# Altium footprint library pcb2D3D库101.PcbLib: 411 footprints (part 6 of 26)
Each footprint in its own frame and in the unit in brackets; x right, y up, seen from the top. Pads: shape width x height; smd on the part's side, far side on the other; paste and mask are expansions set on the pad; w line width, h text height; cw(c..) or ccw(c..) is an arc to the next point about the centre after c.
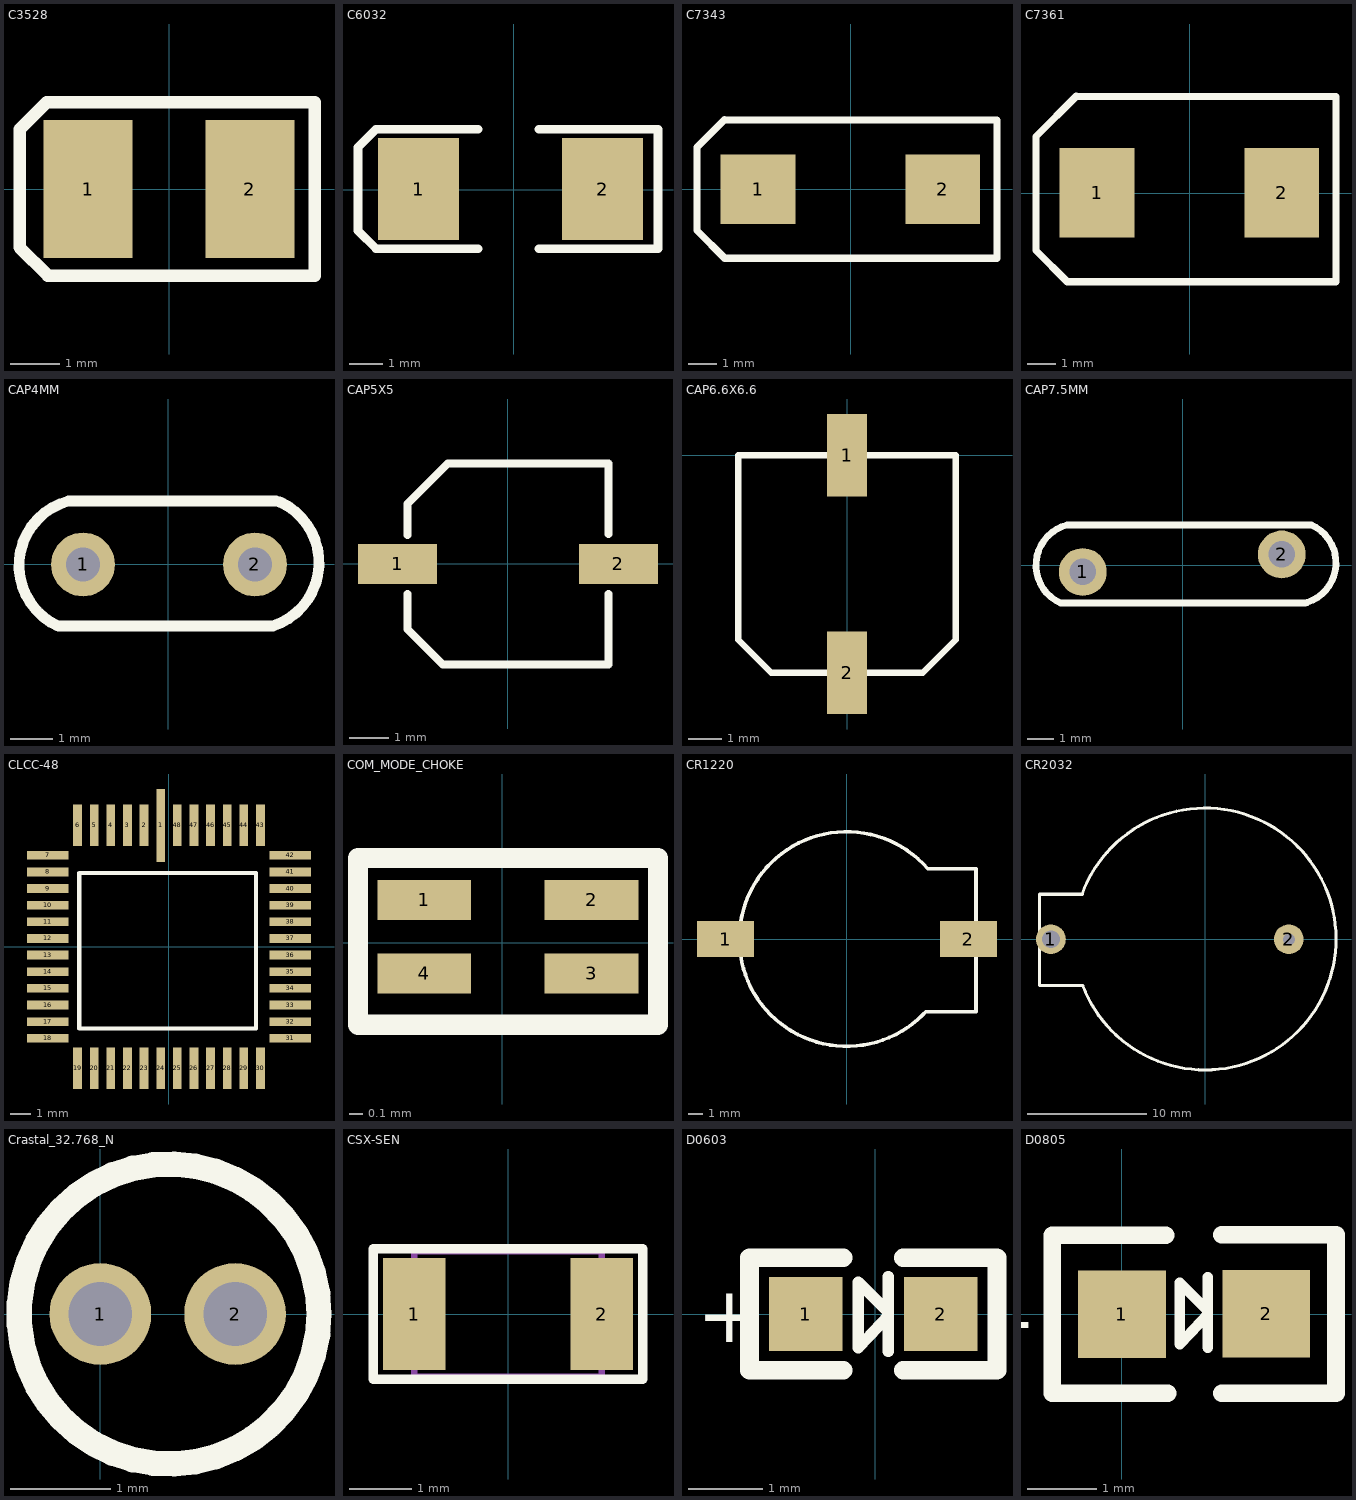
[diagram p5: the footprints below, top view; thin cyan lines are the x and y axes]

## C3528 [mil] "B型"
pads (2):
  rect 70.87x110 smd: 1(-64.5,0) 2(64.5,0)
TopOverlay:
  lines w10: -119,-46.5 -96.5,-69 116,-69 116,69 -97.5,69 -119,47.5 -119,-46.5
3D body "TAJ-B.STEP": height 74.8, standoff 0, extent -68.9,-55.11 68.9,55.12

## C6032 [mil] "C型"
pads (2):
  rect 95x120 smd: 1(-112,1) 2(104,1)
TopOverlay:
  lines w10: -42,-69 -156,-69 -162,-69 -183,-48 -183,50 -163,70 -162,71 -42,71 ; 29,-69 169,-69 169,71 29,71
3D body "TAJ-C.STEP": height 102.36, standoff 0, extent -121.11,-61.99 115.11,63.99

## C7343 [mm] "D型"
pads (2):
  rect 2.6x2.4 smd: 1(-3.202,0.007) 2(3.198,0.007)
TopOverlay:
  lines w0.254: -4.369,-2.388 5.08,-2.388 5.08,2.388 ; -4.362,-2.388 -5.325,-1.425 -5.325,1.457 -4.369,2.413 5.08,2.406
3D body: height 0.3, standoff 0, extent -3.487,-0.869 -3.392,0.82
3D body: height 0.3, standoff 0, extent 3.308,-0.855 3.512,0.915
3D body "TAJ-D.STEP": height 2.9, standoff 0, extent -3.65,-2.124 3.65,2.176

## C7361 [mm] "D型"
pads (2):
  rect 2.6x3.1 smd: 1(-3.202,0.007) 2(3.198,0.007)
TopOverlay:
  lines w0.254: -5.325,-1.99 -4.242,-3.073 5.08,-3.073 5.08,3.352 -3.931,3.359 -5.325,1.965 -5.325,-1.99
3D body "capcp7361x38.step": height 3.45, standoff 0, extent -3.75,-3.048 3.75,3.252

## CAP4MM [mm]
pads (2):
  round 1.5 hole 0.8: 1(-2,0) 2(2.04,0)
TopOverlay:
  lines w0.254: -2.58,-1.45 cw(c-1.94,-0.023) -2.34,1.49 ; -2.52,-1.45 2.42,-1.45 ; -2.32,1.49 2.538,1.49 ; 2.459,-1.447 ccw(c1.98,0.042) 2.62,1.47
3D body "RAD.2.step": height 7.5, standoff -1, extent -3.465,-0.899 3.526,0.798

## CAP5X5 [mm]
pads (2):
  rect 2x1 smd: 1(-2.794,0) 2(2.794,0)
TopOverlay:
  lines w0.2: -2.54,-0.762 -2.54,-1.651 -1.651,-2.54 2.54,-2.54 2.54,-0.762 ; -2.54,0.73 -2.54,1.524 -1.524,2.54 2.54,2.54 2.54,0.762
3D body "SL-B.STEP": height 5.2, standoff 0, extent -2.274,-2.15 2.326,2.15

## CAP6.6X6.6 [mm] "SMDC"
pads (2):
  rect 1.2x2.5 smd: 1(0,0) 2(0,-6.6)
TopOverlay:
  lines w0.2: -3.3,-5.6 -3.3,0 0,0 3.3,0 3.3,-5.6 2.3,-6.6 -2.3,-6.6 -3.3,-5.6
3D body "SL-E.STEP": height 5.2, standoff 0, extent -3.275,-6.802 3.325,0.198

## CAP7.5MM [mm]
pads (2):
  round 1.8 hole 1: 1(-3.759,-0.254) 2(3.734,0.406)
TopOverlay:
  lines w0.254: 4.623,-1.425 -4.597,-1.425 cw(c-3.958,0.003) -4.357,1.516 4.851,1.516 cw(c4.212,0.088) 4.69,-1.401
3D body "final MOV7,5.step": height 18.5, standoff 0, extent -5.5,-0.849 5.784,1

## CLCC-48 [mm]
pads (48):
  rect 0.42x3.5 smd: 1(-0.4,5.84)
  rect 0.42x2 smd: 2(-1.2,5.84) 3(-2,5.84) 4(-2.8,5.84) 5(-3.6,5.84) 6(-4.4,5.84) 19(-4.4,-5.84) 20(-3.6,-5.84) 21(-2.8,-5.84) 22(-2,-5.84) 23(-1.2,-5.84) 24(-0.4,-5.84) 25(0.4,-5.84) 26(1.2,-5.84) 27(2,-5.84) 28(2.8,-5.84) 29(3.6,-5.84) 30(4.4,-5.84) 43(4.4,5.84) 44(3.6,5.84) 45(2.8,5.84) 46(2,5.84) 47(1.2,5.84) 48(0.4,5.84)
  rect 2x0.42 smd: 7(-5.84,4.4) 8(-5.84,3.6) 9(-5.84,2.8) 10(-5.84,2) 11(-5.84,1.2) 12(-5.84,0.4) 13(-5.84,-0.4) 14(-5.84,-1.2) 15(-5.84,-2) 16(-5.84,-2.8) 17(-5.84,-3.6) 18(-5.84,-4.4) 31(5.84,-4.4) 32(5.84,-3.6) 33(5.84,-2.8) 34(5.84,-2) 35(5.84,-1.2) 36(5.84,-0.4) 37(5.84,0.4) 38(5.84,1.2) 39(5.84,2) 40(5.84,2.8) 41(5.84,3.6) 42(5.84,4.4)
TopOverlay:
  lines w0.2: -4.318,-3.937 -4.318,3.556 4.191,3.556 4.191,-3.937 -4.318,-3.937
3D body "User Library-KAC-9628.STEP": height 2.21, standoff 0, extent -7.07,-6.76 7.15,7.46

## COM_MODE_CHOKE [mm]
pads (4):
  rect 0.7x0.3 smd: 1(-0.583,0.321) 2(0.666,0.321) 3(0.666,-0.229) 4(-0.583,-0.229)
TopOverlay:
  lines w0.152: -1.081,-0.614 1.164,-0.614 1.164,0.635 -1.081,0.635 -1.081,-0.614
3D body "User Library-DLP11S.STEP": height 0.82, standoff -0.03, extent -0.61,-0.46 0.69,0.54

## CR1220 [mm]
pads (2):
  rect 4x2.5 smd: 1(-8.458,0) 2(8.509,0)
TopOverlay:
  lines w0.254: 5.303,-5.303 cw(c0,0) 5.671,4.908 ; 5.334,-5.283 5.537,-5.08 8.865,-5.08 9.042,-5.08 9.042,4.902 5.69,4.902
3D body "cr1220smd.STEP": height 4.94, standoff 0, extent -8.996,-7.62 9.504,7.377

## CR2032 [mm] "锂电池座"
pads (2):
  round 2.5 hole 1.5: 1(-12.954,-0.025)
  round 2.5 hole 1: 2(7.036,-0.025)
TopOverlay:
  lines w0.254: -10.324,3.798 cw(c0,0) -10.279,-3.918 ; -10.312,3.759 -13.919,3.759 -13.919,-3.912 -10.236,-3.912
3D body "CR2032.step": height 9.17, standoff -3, extent -15.652,-11.474 11.779,11.526

## Crastal_32.768_N [mil] "32.768k柱式晶振（未加焊）"
height 314.96
pads (2):
  round 40 hole 25: 1(0,0) 2(53,0)
TopOverlay:
  circle w10: c27,0 r59
3D body "CRYSTAL_N.stp": height 354.33, standoff -118.11, extent -32.87,-59.06 85.24,59.06

## CSX-SEN [mm]
height 0.051
pads (2):
  rect 1x1.8 smd: 1(-1.5,0) 2(1.5,0)
TopOverlay:
  lines w0.152: -2.159,-1.041 2.159,-1.041 2.159,1.041 -2.159,1.041 -2.159,-1.041
Mechanical13:
  lines w0.1: -1.5,-1 1.5,-1 1.5,1 -1.5,1 -1.5,-1
3D body "CSX-SEN.STEP": height 1.8, standoff 0, extent -1.5,-0.9 1.5,0.9

## D0603 [mm]
pads (2):
  rect 1x1 smd: 1(-0.94,0) 2(0.889,0)
TopOverlay:
  lines w0.152: 0.178,-0.508 0.178,0.508 ; 0.178,-0.025 -0.229,-0.457 -0.229,0.432 0.178,0.025
  lines w0.254: -0.432,-0.762 -1.702,-0.762 -1.702,0.762 -0.432,0.762 ; 0.381,-0.762 1.651,-0.762 1.651,0.762 0.381,0.762
  text "+" at -2.413,-0.381 h0.76
3D body: height 0.38, standoff 0, extent 0.563,-0.532 0.988,0.532
3D body: height 0.38, standoff 0, extent -1.026,-0.535 -0.602,0.535
3D body: height 0.38, standoff 0, extent -0.603,-0.533 0.567,0.533
3D body: height 0.46, standoff 0, extent -0.28,-0.279 0.255,0.279

## D0805 [mm] "1/8W"
pads (2):
  rect 1.27x1.27 smd: 1(0,0) 2(2.09,0.005)
TopOverlay:
  lines w0.152: 1.245,-0.483 1.245,0.533 ; 1.245,0 0.838,-0.432 0.838,0.457 1.245,0.051
  lines w0.254: 0.635,1.143 -1.011,1.143 -1.011,-1.143 0.66,-1.143 ; 1.448,-1.143 3.099,-1.143 3.099,1.148 1.448,1.148
  text "+" at -1.245,-0.483 h0.76
3D body: height 0.46, standoff 0, extent 0.787,-0.254 1.322,0.305
3D body "R0805.STEP": height 0.55, standoff 0, extent 0.036,-0.62 2.036,0.64